# Altium footprint library My_PCB_6_28.PcbLib: 151 footprints (part 5 of 10)
Each footprint in its own frame and in the unit in brackets; x right, y up, seen from the top. Pads: shape width x height; smd on the part's side, far side on the other; paste and mask are expansions set on the pad; w line width, h text height; cw(c..) or ccw(c..) is an arc to the next point about the centre after c.
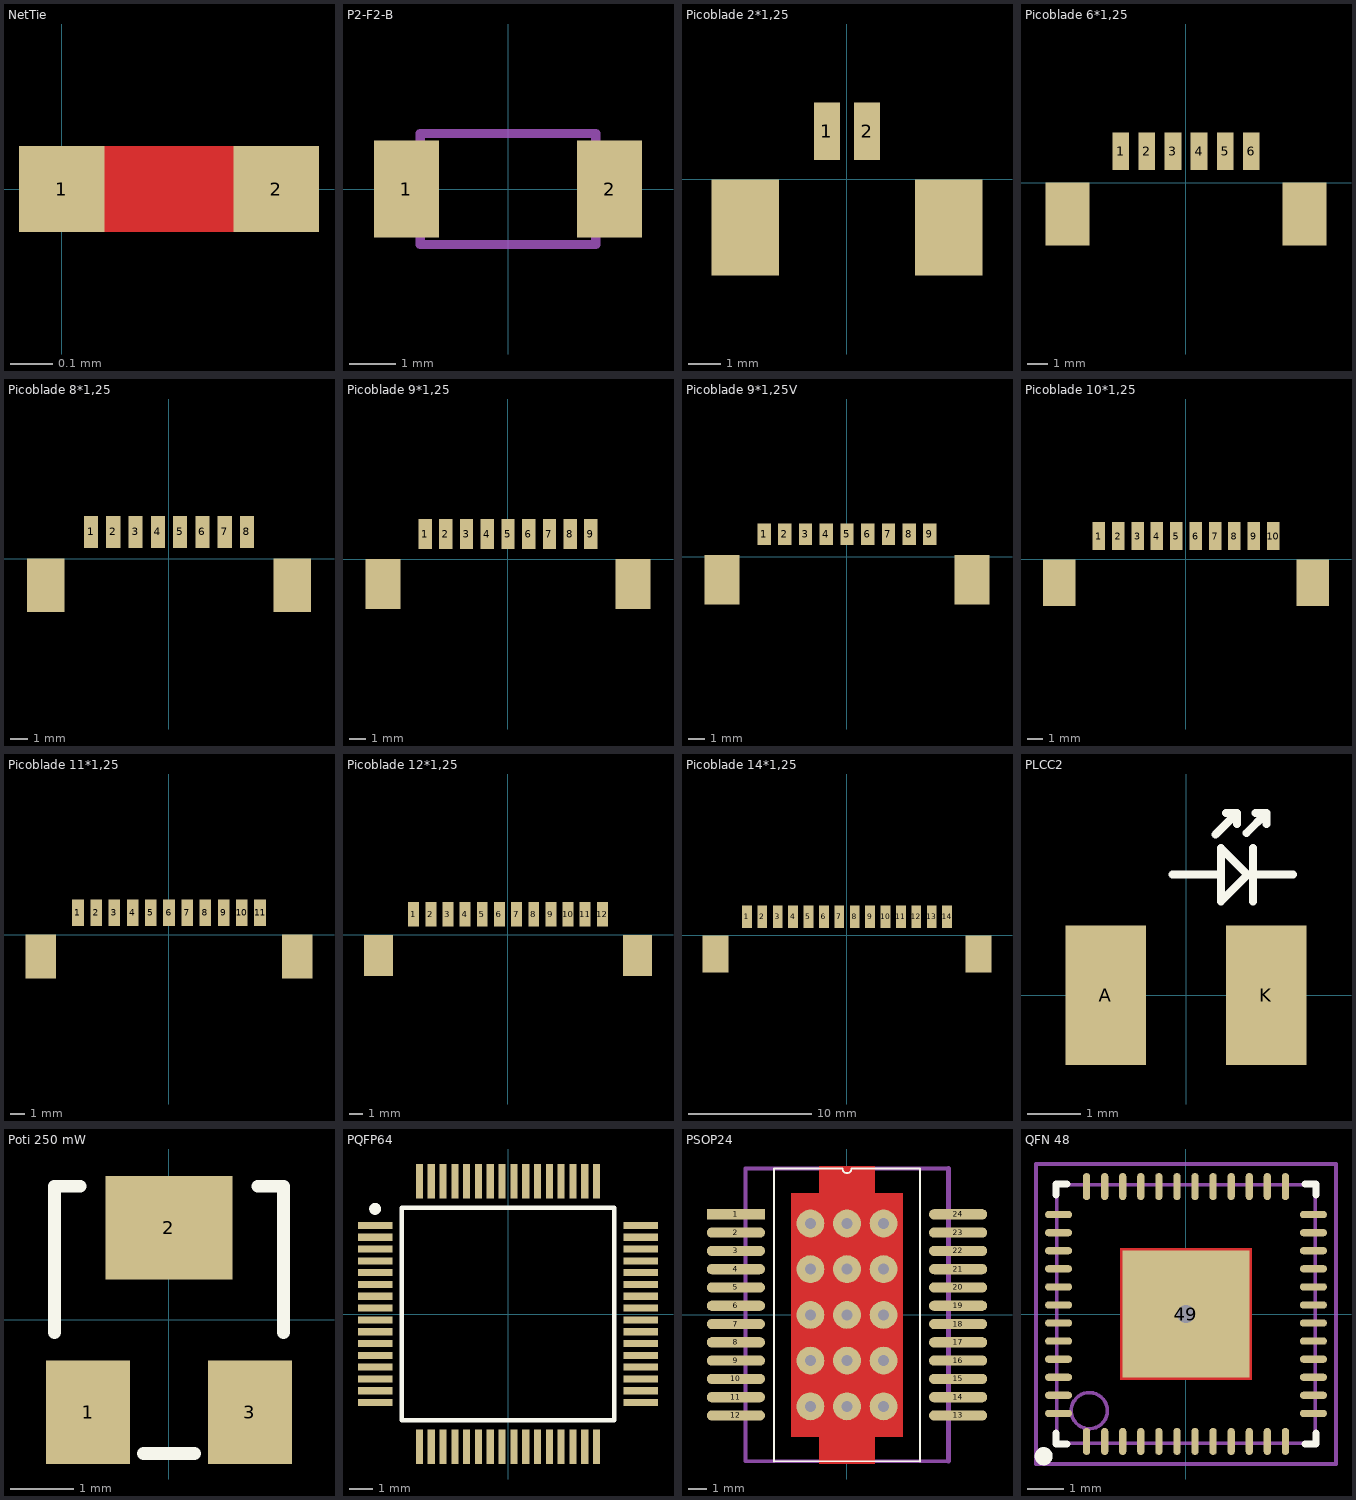
[diagram p4: the footprints below, top view; thin cyan lines are the x and y axes]

## NetTie [mm] "Kleiner Net-Tie um netze zu verbinden"
pads (2):
  rect 0.2x0.2 smd paste-0.2: 1(0,0) 2(0.5,0)
Top Layer:
  lines w0.2: 0,0 0.5,0

## P2-F2-B [mm]
pads (2):
  rect 1.4x2.1 smd: 1(-2.2,0) 2(2.2,0)
Mechanical 1:
  lines w0.2: -1.9,-1.2 -1.9,1.2 1.9,1.2 1.9,-1.2 -1.9,-1.2
3D body: height 2.23, standoff 0.03, extent -1.9,-1.2 1.9,1.2

## Picoblade 2*1,25 [mm]
height 3
pads (4):
  rect 0.8x1.8 smd: 1(-0.625,1.5) 2(0.625,1.5)
  rect 2.1x3 smd: ""(-3.175,-1.5) ""(3.175,-1.5)
3D body: height 3.4, standoff 0, extent -3.825,-3.2 3.825,2

## Picoblade 6*1,25 [mm]
height 3
pads (8):
  rect 0.8x1.8 smd: 1(-3.125,1.5) 2(-1.875,1.5) 3(-0.625,1.5) 4(0.625,1.5) 5(1.875,1.5) 6(3.125,1.5)
  rect 2.1x3 smd: ""(-5.675,-1.5) ""(5.675,-1.5)
3D body: height 3.4, standoff 0, extent -6.325,-3.2 6.325,2

## Picoblade 8*1,25 [mm]
height 3
pads (10):
  rect 0.8x1.8 smd: 1(-4.375,1.5) 2(-3.125,1.5) 3(-1.875,1.5) 4(-0.625,1.5) 5(0.625,1.5) 6(1.875,1.5) 7(3.125,1.5) 8(4.375,1.5)
  rect 2.1x3 smd: ""(-6.925,-1.5) ""(6.925,-1.5)
3D body: height 3.4, standoff 0, extent -7.575,-3.2 7.575,2

## Picoblade 9*1,25 [mm]
pads (11):
  rect 0.8x1.8 smd: 1(-5,1.5) 2(-3.75,1.5) 3(-2.5,1.5) 4(-1.25,1.5) 5(0,1.5) 6(1.25,1.5) 7(2.5,1.5) 8(3.75,1.5) 9(5,1.5)
  rect 2.1x3 smd: ""(-7.55,-1.5) ""(7.55,-1.5)
3D body: height 3.4, standoff 0, extent -8.225,-3.35 8.175,1.85

## Picoblade 9*1,25V [mm]
pads (11):
  rect 0.8x1.3 smd: 1(-5,1.375) 2(-3.75,1.375) 3(-2.5,1.375) 4(-1.25,1.375) 5(0,1.375) 6(1.25,1.375) 7(2.5,1.375) 8(3.75,1.375) 9(5,1.375)
  rect 2.1x3 smd: ""(-7.55,-1.375) ""(7.55,-1.375)
3D body: height 4.7, standoff 0, extent -8.2,-2.6 8.2,1.6

## Picoblade 10*1,25 [mm]
pads (12):
  rect 0.8x1.8 smd: 1(-5.625,1.5) 2(-4.375,1.5) 3(-3.125,1.5) 4(-1.875,1.5) 5(-0.625,1.5) 6(0.625,1.5) 7(1.875,1.5) 8(3.125,1.5) 9(4.375,1.5) 10(5.625,1.5)
  rect 2.1x3 smd: ""(-8.175,-1.5) ""(8.175,-1.5)
3D body: height 3.4, standoff 0, extent -8.825,-3.2 8.825,2

## Picoblade 11*1,25 [mm]
pads (13):
  rect 0.8x1.8 smd: 1(-6.25,1.5) 2(-5,1.5) 3(-3.75,1.5) 4(-2.5,1.5) 5(-1.25,1.5) 6(0,1.5) 7(1.25,1.5) 8(2.5,1.5) 9(3.75,1.5) 10(5,1.5) 11(6.25,1.5)
  rect 2.1x3 smd: ""(-8.8,-1.5) ""(8.8,-1.5)
3D body: height 3.45, standoff 0.05, extent -9.4,-3.2 9.5,2

## Picoblade 12*1,25 [mm]
pads (14):
  rect 0.8x1.8 smd: 1(-6.875,1.5) 2(-5.625,1.5) 3(-4.375,1.5) 4(-3.125,1.5) 5(-1.875,1.5) 6(-0.625,1.5) 7(0.625,1.5) 8(1.875,1.5) 9(3.125,1.5) 10(4.375,1.5) 11(5.625,1.5) 12(6.875,1.5)
  rect 2.1x3 smd: ""(-9.425,-1.5) ""(9.425,-1.5)
3D body: height 3.45, standoff 0.05, extent -10.075,-3.2 10.075,2

## Picoblade 14*1,25 [mm]
pads (16):
  rect 0.8x1.8 smd: 1(-8.125,1.5) 2(-6.875,1.5) 3(-5.625,1.5) 4(-4.375,1.5) 5(-3.125,1.5) 6(-1.875,1.5) 7(-0.625,1.5) 8(0.625,1.5) 9(1.875,1.5) 10(3.125,1.5) 11(4.375,1.5) 12(5.625,1.5) 13(6.875,1.5) 14(8.125,1.5)
  rect 2.1x3 smd: ""(-10.675,-1.5) ""(10.675,-1.5)
3D body: height 3.45, standoff 0.05, extent -11.325,-3.2 11.325,2

## PLCC2 [mm]
pads (2):
  rect 1.5x2.6 smd: A(-1.5,0) K(1.5,0)
Top Overlay:
  lines w0.15: -0.25,2.25 0.65,2.25 ; 0.55,3 0.95,3.4 ; 0.75,3.4 0.95,3.4 ; 0.95,3.2 0.95,3.4 ; 1.125,3.025 1.5,3.4 ; 1.25,1.75 1.25,2.75 ; 1.3,3.4 1.5,3.4 ; 1.5,3.2 1.5,3.4 ; 2,2.25 1.15,2.25 ; 1.15,2.25 0.65,2.75 0.65,1.75 1.15,2.25
3D body: height 1.8, standoff -0.02, extent -1.775,-1.4 1.775,1.4

## Poti 250 mW [mm]
height 15
pads (3):
  rect 1.32x1.63 smd: 1(-1.27,-1.45) 3(1.27,-1.45)
  rect 2x1.63 smd: 2(0,1.45)
Top Overlay:
  lines w0.2: -1.8,-0.2 -1.8,2.1 -1.4,2.1 ; -0.4,-2.1 0.4,-2.1 ; 1.4,2.1 1.8,2.1 1.8,-0.2
3D body: height 5.29, standoff 0, extent -2.426,-1.978 2.4,1.978

## PQFP64 [mm] "QFP, Plastic; 64 Leads; Body 10 x 10 mm; Pitch 0.5 mm"
height 1.2
pads (64):
  rect 1.45x0.3 smd: 1(-5.625,3.75) 2(-5.625,3.25) 3(-5.625,2.75) 4(-5.625,2.25) 5(-5.625,1.75) 6(-5.625,1.25) 7(-5.625,0.75) 8(-5.625,0.25) 9(-5.625,-0.25) 10(-5.625,-0.75) 11(-5.625,-1.25) 12(-5.625,-1.75) 13(-5.625,-2.25) 14(-5.625,-2.75) 15(-5.625,-3.25) 16(-5.625,-3.75) 33(5.625,-3.75) 34(5.625,-3.25) 35(5.625,-2.75) 36(5.625,-2.25) 37(5.625,-1.75) 38(5.625,-1.25) 39(5.625,-0.75) 40(5.625,-0.25) 41(5.625,0.25) 42(5.625,0.75) 43(5.625,1.25) 44(5.625,1.75) 45(5.625,2.25) 46(5.625,2.75) 47(5.625,3.25) 48(5.625,3.75)
  rect 0.3x1.45 smd: 17(-3.75,-5.625) 18(-3.25,-5.625) 19(-2.75,-5.625) 20(-2.25,-5.625) 21(-1.75,-5.625) 22(-1.25,-5.625) 23(-0.75,-5.625) 24(-0.25,-5.625) 25(0.25,-5.625) 26(0.75,-5.625) 27(1.25,-5.625) 28(1.75,-5.625) 29(2.25,-5.625) 30(2.75,-5.625) 31(3.25,-5.625) 32(3.75,-5.625) 49(3.75,5.625) 50(3.25,5.625) 51(2.75,5.625) 52(2.25,5.625) 53(1.75,5.625) 54(1.25,5.625) 55(0.75,5.625) 56(0.25,5.625) 57(-0.25,5.625) 58(-0.75,5.625) 59(-1.25,5.625) 60(-1.75,5.625) 61(-2.25,5.625) 62(-2.75,5.625) 63(-3.25,5.625) 64(-3.75,5.625)
Top Overlay:
  circle w0.25: c-5.625,4.45 r0.125
  lines w0.2: -4.5,-4.5 4.5,-4.5 4.5,4.5 -4.5,4.5 -4.5,-4.5

## PSOP24 [mm]
pads (39):
  rect 3.18x0.56 smd: 1(-6.075,5.5)
  oval 3.18x0.56 smd: 2(-6.075,4.5) 3(-6.075,3.5) 4(-6.075,2.5) 5(-6.075,1.5) 6(-6.075,0.5) 7(-6.075,-0.5) 8(-6.075,-1.5) 9(-6.075,-2.5) 10(-6.075,-3.5) 11(-6.075,-4.5) 12(-6.075,-5.5) 13(6.075,-5.5) 14(6.075,-4.5) 15(6.075,-3.5) 16(6.075,-2.5) 17(6.075,-1.5) 18(6.075,-0.5) 19(6.075,0.5) 20(6.075,1.5) 21(6.075,2.5) 22(6.075,3.5) 23(6.075,4.5) 24(6.075,5.5)
  round 1.524 hole 0.6: ""(-2,-5) ""(-2,-2.5) ""(-2,0) ""(-2,2.5) ""(-2,5) ""(0,-5) ""(0,-2.5) ""(0,0) ""(0,2.5) ""(0,5) ""(2,-5) ""(2,-2.5) ""(2,0) ""(2,2.5)
  round 1.524 hole 0.62: ""(2,5)
Top Layer:
  rectangle: -3.065,-6.67 3.065,6.67
  rectangle: -1.535,-8.153 1.535,8.153
Top Overlay:
  lines w0.1: -4,-8.01 -4,8 -0.25,8 ccw(c0,8) 0.25,8 4,8 4,-8.01 ; -4,-8 4,-8
Mechanical 13:
  lines w0.2: 5.55,-8 -5.55,-8 -5.55,8 5.55,8
  lines w0.254: 5.55,-8 5.55,8
3D body: height 3.35, standoff 0.05, extent -7.119,-8 7.119,8

## QFN 48 [mm]
height 0.9
pads (49):
  oval 0.2x0.75 smd: 1(-2.75,-3.525) 2(-2.25,-3.525) 3(-1.75,-3.525) 4(-1.25,-3.525) 5(-0.75,-3.525) 6(-0.25,-3.525) 7(0.25,-3.525) 8(0.75,-3.525) 9(1.25,-3.525) 10(1.75,-3.525) 11(2.25,-3.525) 12(2.75,-3.525) 25(2.75,3.525) 26(2.25,3.525) 27(1.75,3.525) 28(1.25,3.525) 29(0.75,3.525) 30(0.25,3.525) 31(-0.25,3.525) 32(-0.75,3.525) 33(-1.25,3.525) 34(-1.75,3.525) 35(-2.25,3.525) 36(-2.75,3.525)
  oval 0.75x0.2 smd: 13(3.525,-2.75) 14(3.525,-2.25) 15(3.525,-1.75) 16(3.525,-1.25) 17(3.525,-0.75) 18(3.525,-0.25) 19(3.525,0.25) 20(3.525,0.75) 21(3.525,1.25) 22(3.525,1.75) 23(3.525,2.25) 24(3.525,2.75) 37(-3.525,2.75) 38(-3.525,2.25) 39(-3.525,1.75) 40(-3.525,1.25) 41(-3.525,0.75) 42(-3.525,0.25) 43(-3.525,-0.25) 44(-3.525,-0.75) 45(-3.525,-1.25) 46(-3.525,-1.75) 47(-3.525,-2.25) 48(-3.525,-2.75)
  rect 3.5x3.5 / inner rect 1x1 / far side rect 1x1 hole 0.5: 49(0,0)
Top Layer:
  region: 1.824,-1.825 1.824,1.825 -1.826,1.825 -1.826,-1.825
Top Overlay:
  circle w0.25: c-3.937,-3.935 r0.125
  lines w0.2: -3.6,-3.3 -3.6,-3.6 -3.3,-3.6 ; -3.6,3.3 -3.6,3.6 -3.3,3.6 ; 3.3,-3.6 3.6,-3.6 3.6,-3.3 ; 3.3,3.6 3.6,3.6 3.6,3.3
Mechanical 13:
  circle w0.1: c-2.675,-2.675 r0.5
  lines w0.1: -3.575,-3.575 3.575,-3.575 3.575,3.575 -3.575,3.575 -3.575,-3.575
Mechanical 15:
  lines w0.1: -0.5,0 0.5,0 ; 0,-0.5 0,0.5 ; -4.15,-4.15 4.15,-4.15 4.15,4.15 -4.15,4.15 -4.15,-4.15
3D body: height 0.9, standoff 0, extent -3.575,-3.575 3.575,3.575